# Altium footprint library Pasivos.PcbLib: 55 footprints (part 3 of 4)
Each footprint in its own frame and in the unit in brackets; x right, y up, seen from the top. Pads: shape width x height; smd on the part's side, far side on the other; paste and mask are expansions set on the pad; w line width, h text height; cw(c..) or ccw(c..) is an arc to the next point about the centre after c.
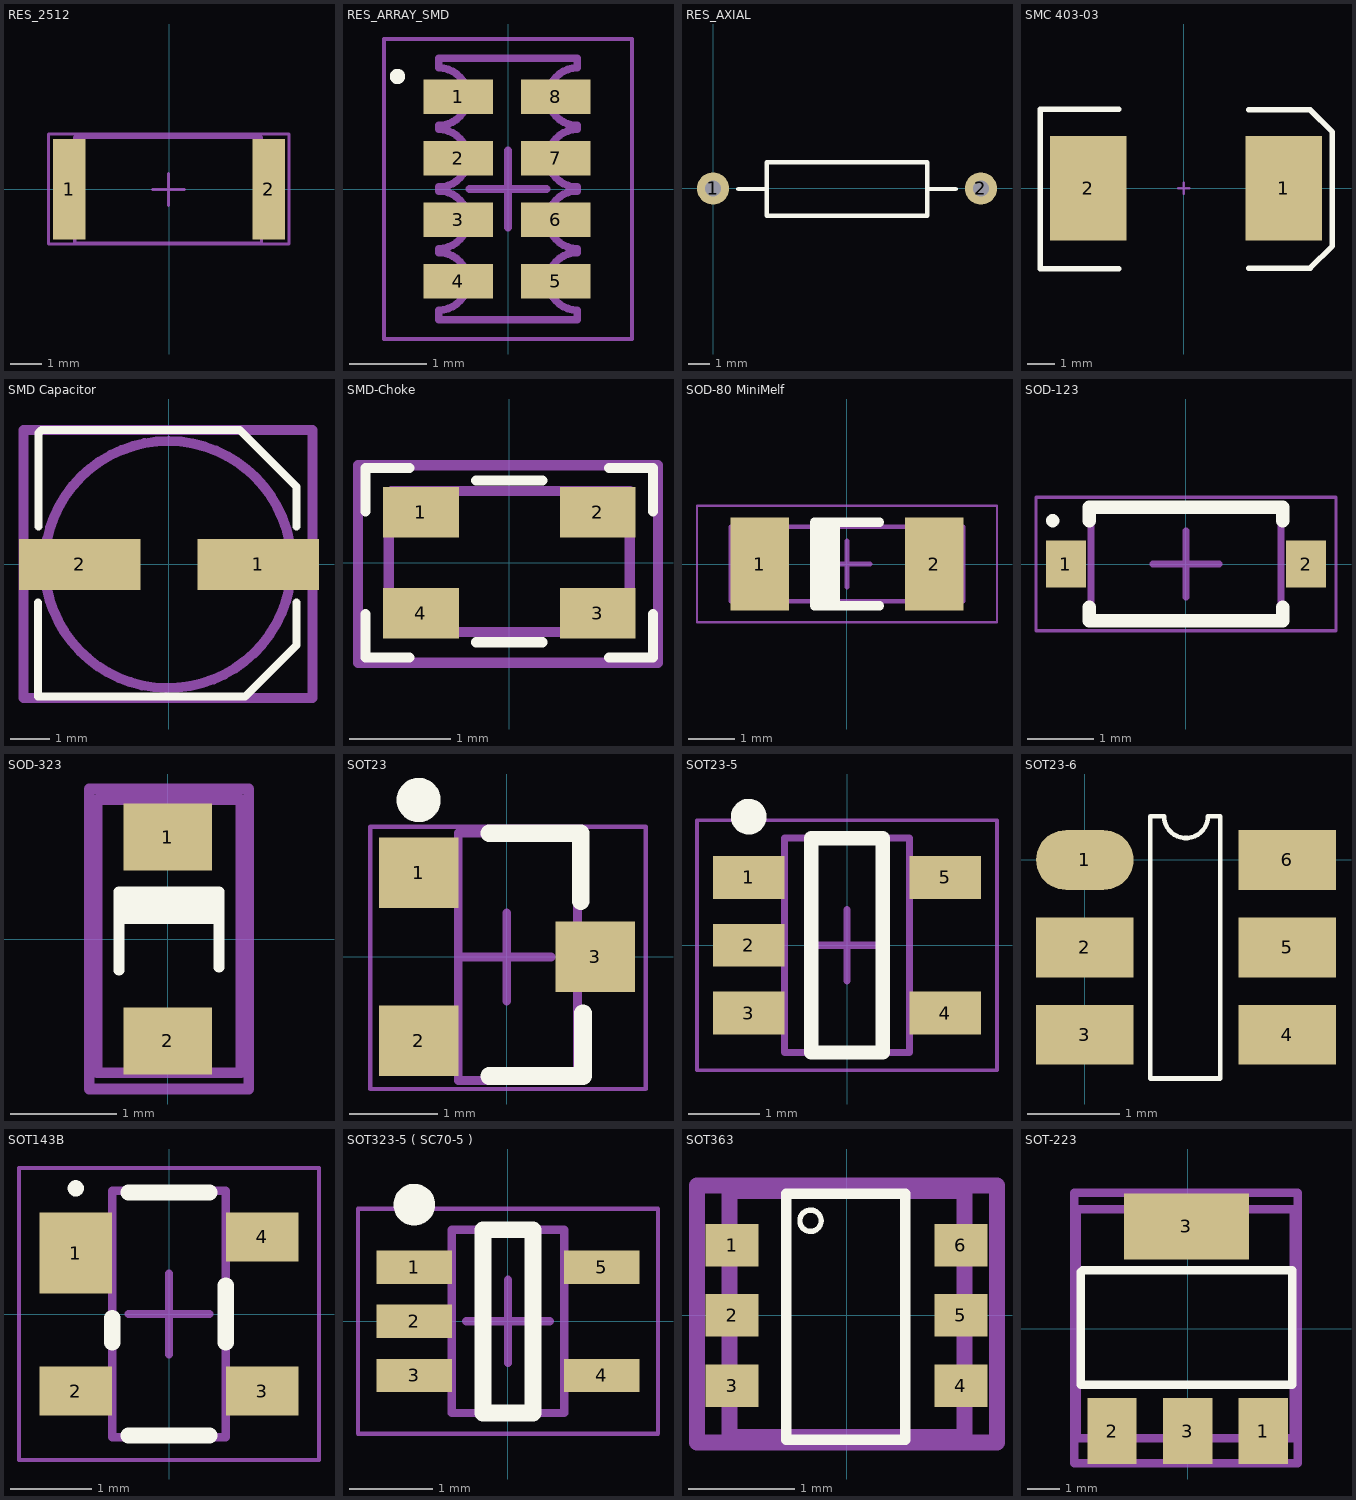
[diagram p2: the footprints below, top view; thin cyan lines are the x and y axes]

## RES_2512 [mm] "Chip Capacitor, Body 2.54x1.27mm, IPC High Density"
height 1.3
pads (2):
  rect 1.02x3.18 smd: 1(-3.162,0) 2(3.162,0)
Mechanical 13:
  lines w0.1: -2.984,-1.702 2.934,-1.702 2.934,1.651 -2.984,1.651 -2.984,-1.702
Mechanical 15:
  lines w0.1: -0.513,0 0.487,0 ; -0.013,-0.5 -0.013,0.5 ; -3.823,-1.727 3.797,-1.727 3.797,1.753 -3.823,1.753 -3.823,-1.727
3D body: height 0.62, standoff 0, extent -3.17,-1.575 3.15,1.626

## RES_ARRAY_SMD [mm] "TC164 Series Chip Array Resistor"
height 0.6
pads (8):
  rect 0.9x0.45 smd: 1(-0.646,1.2) 2(-0.646,0.4) 3(-0.646,-0.4) 4(-0.646,-1.2) 5(0.621,-1.2) 6(0.621,-0.4) 7(0.621,0.4) 8(0.621,1.2)
Top Overlay:
  circle w0.1: c-1.437,1.463 r0.05
Mechanical 13:
  lines w0.1: -0.9,-1.7 0.9,-1.7 0.9,-1.575 cw(c0.9,-1.2) 0.9,-0.825 0.9,-0.775 cw(c0.9,-0.4) 0.9,-0.025 0.9,0.025 cw(c0.9,0.4) 0.9,0.775 0.9,0.825 cw(c0.9,1.2) 0.9,1.575 0.9,1.7 -0.9,1.7 -0.9,1.575 cw(c-0.9,1.2) -0.9,0.825 -0.9,0.775 cw(c-0.9,0.4) -0.9,0.025 -0.9,-0.025 cw(c-0.9,-0.4) -0.9,-0.775 -0.9,-0.825 cw(c-0.9,-1.2) -0.9,-1.575 -0.9,-1.7
Mechanical 15:
  lines w0.05: -1.61,-1.95 1.61,-1.95 1.61,1.95 -1.61,1.95 -1.61,-1.95
  lines w0.1: -0.5,0 0.5,0 ; 0,-0.5 0,0.5
3D body: height 0.55, standoff 0, extent -0.825,-1.6 0.775,1.6

## RES_AXIAL [mil] "Resistor Axial"
pads (2):
  round 60 hole 30: 1(0,0) 2(500,0)
Top Overlay:
  lines w7.87: 47,-1 100,-1 ; 400,-1 453,-1 ; 100,-51 100,49 400,49 400,-51 100,-51
3D body: height 172.24, standoff -196.85, extent -14.76,-74.82 514.76,72.82

## SMC 403-03 [mil] "SMC; 2 C-Bend Leads"
height 104.33
pads (2):
  rect 110x150 smd: 1(144.17,0) 2(-137.81,0)
Top Overlay:
  lines w7.87: -93.5,-116 -207,-116 -207,114 -93.5,114 ; 93.5,-115 182,-115 214,-83 214,80.76 182.11,113 93.5,113
Mechanical 1:
  lines w3.94: -7.87,0 7.87,0 ; 0,-7.87 0,7.87
3D body: height 86.61, standoff 0, extent -156.48,-118.13 158.48,116.13

## SMD Capacitor [mm] "SMD Aluminum Cap. 6.3x6.3 mm"
pads (2):
  rect 3.1x1.3 smd: 1(2.275,0) 2(-2.275,0)
Top Overlay:
  lines w0.2: -3.338,-0.965 -3.338,-3.368 1.941,-3.368 3.251,-2.057 3.251,-0.965 ; -3.327,0.965 -3.327,3.353 -3.251,3.429 1.803,3.429 3.251,1.981 3.251,0.972
Mechanical 13:
  lines w0.254: 2.991,0.908 ccw(c-0.025,0) 3.007,0.852
Mechanical 15:
  lines w0.254: -3.708,-3.404 -3.708,3.429 3.658,3.429 3.658,-3.404 -3.708,-3.404
3D body: height 3.91, standoff 0, extent -3.52,-3.3 3.48,3.3

## SMD-Choke [mm] "2 Line Common Mode Choke Surface Mount - DLW21H"
pads (4):
  rect 0.75x0.5 smd: 1(-0.875,0.5) 2(0.875,0.5) 3(0.875,-0.5) 4(-0.875,-0.5)
Top Overlay:
  lines w0.1: -1.422,-0.508 -1.422,-0.94 -0.991,-0.94 ; -1.422,0.508 -1.422,0.94 -0.991,0.94 ; -0.33,-0.787 0.33,-0.787 ; -0.33,0.813 0.33,0.813 ; 0.991,-0.94 1.422,-0.94 1.422,-0.508 ; 0.991,0.94 1.422,0.94 1.422,0.508
Mechanical 13:
  lines w0.1: -1.194,0.686 -1.194,-0.686 1.194,-0.686 1.194,0.711 -1.168,0.711
Mechanical 15:
  lines w0.1: -1.499,-0.991 -1.499,0.965 1.473,0.965 1.473,-0.991 -1.499,-0.991
3D body: height 1, standoff 0, extent -1.162,-0.692 1.139,0.708

## SOD-80 MiniMelf [mm] "FDLL4148 Small Signal Diode"
height 1.6
pads (2):
  rect 1.25x2 smd: 1(-1.875,0) 2(1.875,0)
Top Overlay:
  rectangle: -0.7,-0.9 -0.15,0.9
  lines w0.2: 0.7,-0.9 -0.7,-0.9 -0.7,0.9 0.7,0.9
Mechanical 13:
  lines w0.1: -2.5,-0.8 2.5,-0.8 2.5,0.8 -2.5,0.8 -2.5,-0.8
Mechanical 15:
  lines w0.05: -3.225,-1.25 3.225,-1.25 3.225,1.25 -3.225,1.25 -3.225,-1.25
  lines w0.1: -0.5,0 0.5,0 ; 0,-0.5 0,0.5
3D body: height 1.6, standoff 0, extent -1.854,-0.798 1.846,0.798

## SOD-123 [mm] "SODFL, 2-Leads, Body 1.55x3.65mm, IPC Medium Density"
height 1.45
pads (2):
  rect 0.6x0.7 smd: 1(-1.8,0) 2(1.8,0)
Top Overlay:
  circle w0.1: c-2,0.65 r0.05
  lines w0.2: -1.45,-0.65 -1.45,-0.85 1.45,-0.85 1.45,-0.65 ; -1.45,0.65 -1.45,0.85 1.45,0.85 1.45,0.65
Mechanical 13:
  lines w0.1: -1.425,-0.85 -1.425,0.85 1.425,0.85 1.425,-0.85 -1.425,-0.85
Mechanical 15:
  lines w0.05: -2.25,-1 -2.25,1 2.25,1 2.25,-1 -2.25,-1
  lines w0.1: -0.5,0 0.5,0 ; 0,-0.5 0,0.5
3D body: height 1.43, standoff -0.02, extent -1.95,-0.838 1.9,0.862

## SOD-323 [mm] "SOD-323 Package"
pads (2):
  rect 0.83x0.63 smd: 1(0,0.958) 2(0,-0.957)
Top Overlay:
  rectangle: -0.457,0.14 0.483,0.445
  lines w0.1: -0.457,-0.292 -0.457,0.445 0.483,0.445 0.483,-0.266
Mechanical 13:
  lines w0.1: -0.66,-1.257 0.686,-1.257 0.686,1.308 -0.66,1.308 -0.66,-1.257
Mechanical 15:
  lines w0.1: -0.737,-1.409 -0.737,1.41 0.762,1.41 0.762,-1.409 -0.737,-1.409
  text "+" at -0.305,-0.292 h0.75
3D body: height 1.1, standoff 0, extent -0.715,-1.287 0.635,1.313

## SOT23 [mm] "BC848B"
height 1
pads (3):
  rect 0.9x0.8 smd: 1(-1,0.95) 2(-1,-0.95) 3(1,0)
Top Overlay:
  circle w0.25: c-1,1.775 r0.125
  lines w0.2: -0.2,-1.351 0.862,-1.351 0.862,-0.64 ; -0.2,1.4 0.836,1.4 0.836,0.63
Mechanical 13:
  lines w0.1: -0.55,-1.402 -0.55,1.4 0.8,1.4 0.8,-1.402 -0.55,-1.402
Mechanical 15:
  lines w0.05: -1.549,-1.499 -1.549,1.473 1.575,1.473 1.575,-1.499 -1.549,-1.499
  lines w0.1: -0.502,-0.005 0.498,-0.005 ; -0.002,-0.505 -0.002,0.495
3D body: height 1.3, standoff 0, extent -1.426,-1.505 1.574,1.495

## SOT23-5 [mm] "SOT23-5 package"
height 1.45
pads (5):
  rect 1x0.6 smd: 1(-1.375,0.95) 2(-1.375,0) 3(-1.375,-0.95) 4(1.375,-0.95) 5(1.375,0.95)
Top Overlay:
  circle w0.25: c-1.375,1.8 r0.125
  lines w0.2: -0.5,-1.5 0.5,-1.5 0.5,1.5 -0.5,1.5 -0.5,-1.5
Mechanical 13:
  lines w0.1: -0.875,-1.5 -0.875,1.5 0.875,1.5 0.875,-1.5 -0.875,-1.5
Mechanical 15:
  lines w0.05: -2.1,-1.75 -2.1,1.75 2.1,1.75 2.1,-1.75 -2.1,-1.75
  lines w0.1: -0.5,0 0.5,0 ; 0,-0.5 0,0.5
3D body: height 1.1, standoff 0, extent -1.25,-1.476 1.25,1.524

## SOT23-6 [mm] "SOT-23-6 (SC-74): Surface mounted, 6 pin package"
pads (6):
  oval 1.06x0.65 smd: 1(0,0)
  rect 1.06x0.65 smd: 2(0,-0.95) 3(0,-1.9) 4(2.2,-1.9) 5(2.2,-0.95) 6(2.2,0)
Top Overlay:
  lines w0.05: 0.847,0.475 0.711,0.475 0.711,-2.375 1.473,-2.375 1.473,0.475 1.338,0.475 cw(c1.1,0.475) 0.863,0.475
3D body: height 0.86, standoff 0, extent -0.312,-2.465 2.497,0.535

## SOT143B [mm] "SOT143, 4-Leads, Body 2.92x2.30mm, Pitch 1.90mm, IPC Medium Density"
height 1.1
pads (4):
  rect 0.9x1 smd: 1(-1.15,0.75)
  rect 0.9x0.6 smd: 2(-1.15,-0.95) 3(1.15,-0.95) 4(1.15,0.95)
Top Overlay:
  circle w0.1: c-1.15,1.55 r0.05
  lines w0.2: -0.7,-0.35 -0.7,-0.05 ; -0.5,-1.5 0.5,-1.5 ; -0.5,1.5 0.5,1.5 ; 0.7,-0.35 0.7,0.35
Mechanical 13:
  lines w0.1: -0.7,-1.52 0.7,-1.52 0.7,1.52 -0.7,1.52 -0.7,-1.52
Mechanical 15:
  lines w0.05: -1.85,-1.8 1.85,-1.8 1.85,1.8 -1.85,1.8 -1.85,-1.8
  lines w0.1: -0.5,0 0.5,0 ; 0,-0.5 0,0.5
3D body: height 1.09, standoff 0, extent -1.219,-1.499 1.27,1.499

## SOT323-5 ( SC70-5 ) [mm] "SOT23, 5-Leads, Body 2.00x2.10mm, Pitch 0.65mm, IPC Medium Density"
height 1.1
pads (5):
  rect 0.9x0.4 smd: 1(-1.125,0.65) 2(-1.125,0) 3(-1.125,-0.65) 4(1.125,-0.65) 5(1.125,0.65)
Top Overlay:
  circle w0.25: c-1.125,1.4 r0.125
  lines w0.2: -0.3,-1.1 -0.3,1.1 0.3,1.1 0.3,-1.1 -0.3,-1.1
Mechanical 13:
  lines w0.1: -0.675,-1.1 0.675,-1.1 0.675,1.1 -0.675,1.1 -0.675,-1.1
Mechanical 15:
  lines w0.05: -1.8,-1.35 1.8,-1.35 1.8,1.35 -1.8,1.35 -1.8,-1.35
  lines w0.1: -0.5,0 0.5,0 ; 0,-0.5 0,0.5
3D body: height 1.1, standoff 0, extent -1.2,-1.1 1.2,1.1

## SOT363 [mm] "TSSOP6; SC-88; SC-70-6"
pads (6):
  rect 0.5x0.4 smd: 1(-1.075,0.66) 2(-1.075,0) 3(-1.075,-0.66) 4(1.075,-0.66) 5(1.075,0) 6(1.075,0.66)
Top Overlay:
  circle w0.05: c-0.338,0.889 r0.1
  lines w0.1: -0.567,-1.168 -0.567,1.143 0.551,1.143 0.551,-1.168 -0.567,-1.168
Mechanical 13:
  lines w0.15: -1.1,1.143 -1.1,-1.143 1.109,-1.143 1.109,1.168 -1.075,1.168
Mechanical 15:
  lines w0.15: -1.405,-1.194 -1.405,1.219 1.414,1.219 1.414,-1.194 -1.405,-1.194
3D body: height 1.11, standoff 0, extent -1.108,-1.125 1.142,1.125

## SOT-223 [mm] "Surface mounted, 4 pin package; LM1117, MC33269"
pads (4):
  rect 1.5x2 smd: 1(2.3,-3.111) 2(-2.3,-3.111) 3(0,-3.111)
  rect 3.8x2 smd: 3(-0.039,3.111)
Top Overlay:
  lines w0.254: -3.251,-1.702 -3.251,1.727 -3.2,1.778 3.175,1.778 3.175,-1.702 -3.251,-1.702
Mechanical 13:
  lines w0.254: -3.378,3.556 -3.378,-3.327 3.226,-3.327 3.226,3.632 -3.302,3.632
Mechanical 15:
  lines w0.254: -3.454,-4.089 -3.454,4.14 3.353,4.14 3.353,-4.089 -3.454,-4.089
3D body: height 1.64, standoff -0.04, extent -3.263,-3.301 3.237,3.631